# Altium footprint library Evaluation Board.PcbLib: 121 footprints (part 7 of 8)
Each footprint in its own frame and in the unit in brackets; x right, y up, seen from the top. Pads: shape width x height; smd on the part's side, far side on the other; paste and mask are expansions set on the pad; w line width, h text height; cw(c..) or ccw(c..) is an arc to the next point about the centre after c.
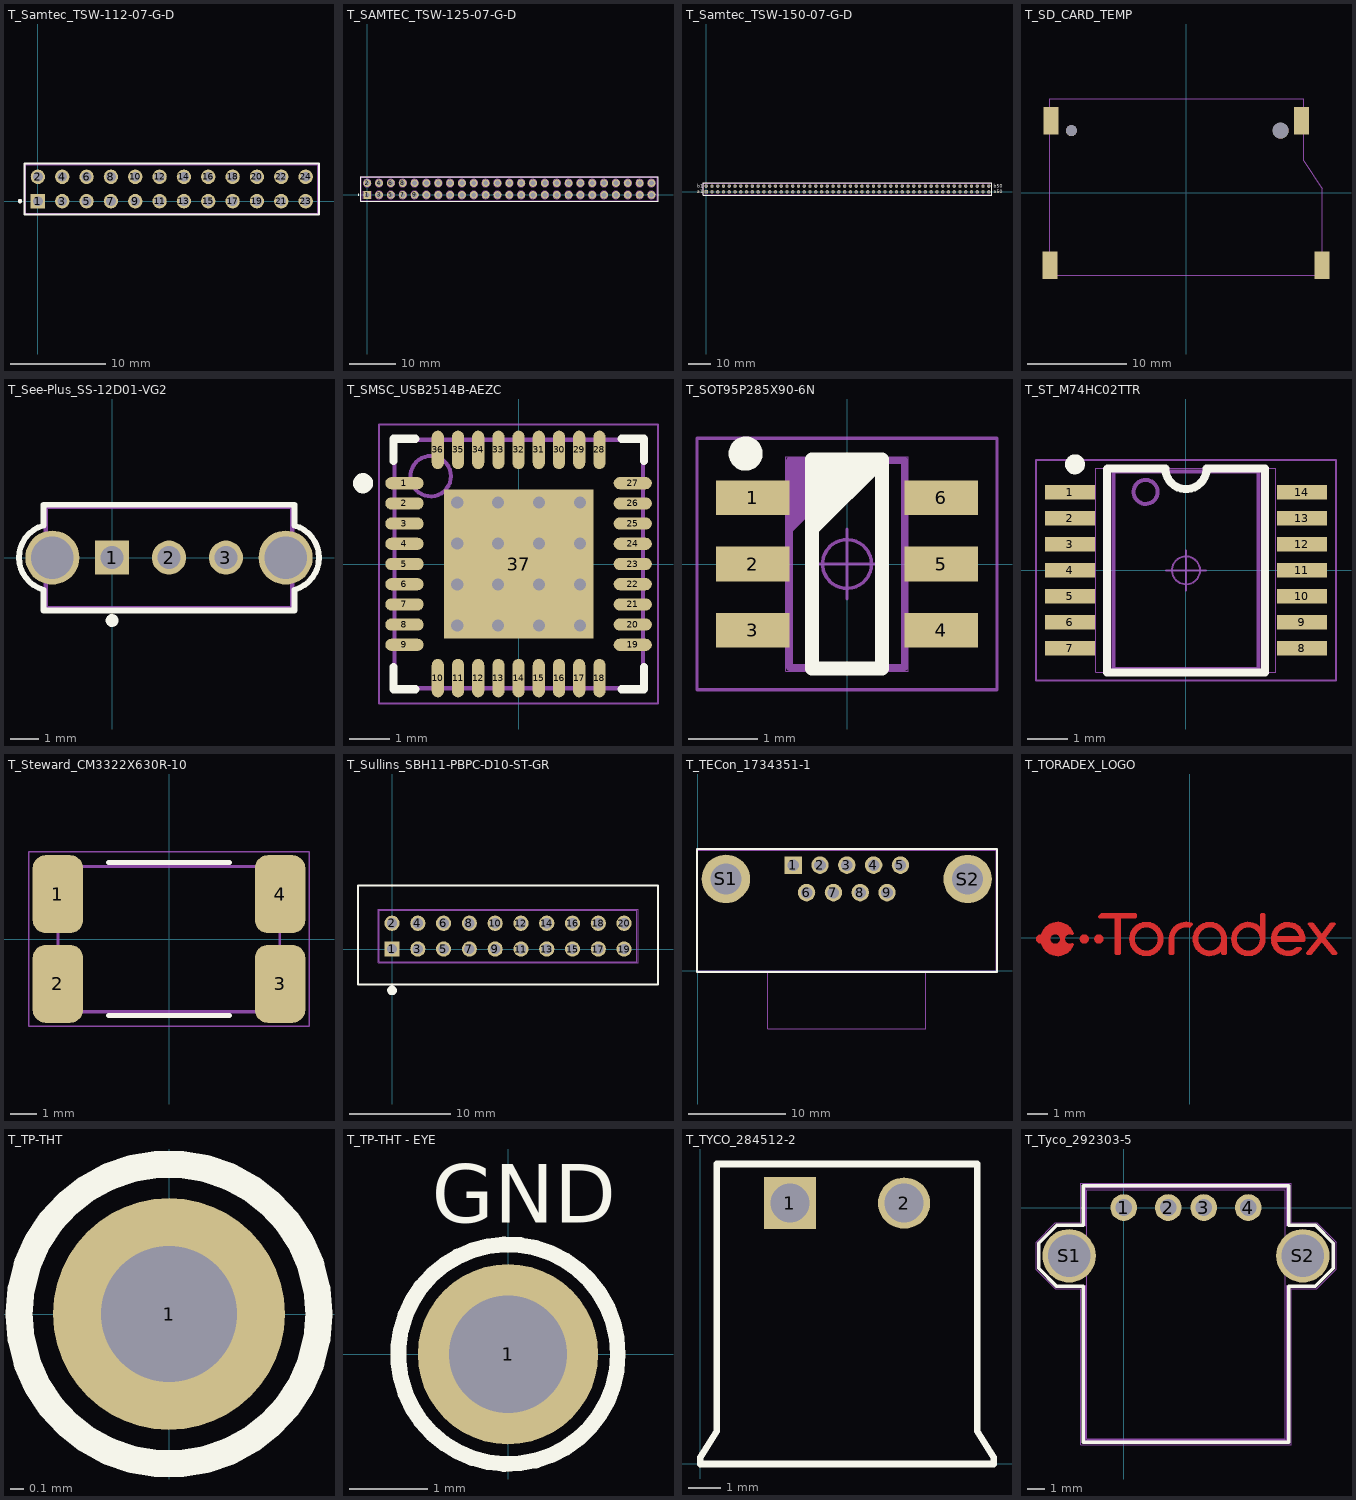
[diagram p6: the footprints below, top view; thin cyan lines are the x and y axes]

## T_Samtec_TSW-112-07-G-D [mm] "Header, 2x12 Pins, 2.54 mm pitch, male"
height 8.51
pads (24):
  rect 1.5x1.5 hole 1.016: 1(0,0)
  round 1.5 hole 1.016: 2(0,2.54) 3(2.54,0) 4(2.54,2.54) 5(5.08,0) 6(5.08,2.54) 7(7.62,0) 8(7.62,2.54) 9(10.16,0) 10(10.16,2.54) 11(12.7,0) 12(12.7,2.54) 13(15.24,0) 14(15.24,2.54) 15(17.78,0) 16(17.78,2.54) 17(20.32,0) 18(20.32,2.54) 19(22.86,0) 20(22.86,2.54) 21(25.4,0) 22(25.4,2.54) 23(27.94,0) 24(27.94,2.54)
Top Overlay:
  circle w0.25: c-1.871,0 r0.1
  lines w0.2: -1.395,-1.395 -1.395,3.935 29.335,3.935 29.335,-1.395 -1.395,-1.395
Mechanical 1:
  lines w0.05: -1.37,-1.373 -1.37,3.91 29.31,3.91 29.31,-1.373 -1.37,-1.373
Mechanical 2:
  lines w0.001: -1.27,-1.27 -1.27,3.81 29.21,3.81 29.21,-1.27 -1.27,-1.27
Mechanical 3:
  lines w0.1: -1.37,-1.37 -1.37,3.91 29.31,3.91 29.31,-1.37 -1.37,-1.37
3D body: height 8.4, standoff -2.52, extent -1.27,-1.27 29.21,3.81

## T_SAMTEC_TSW-125-07-G-D [mm] "Header, 2x25 Pins, 2.54 mm pitch"
height 8.51
pads (50):
  rect 1.65x1.65 hole 1.016: 1(0,0)
  round 1.65 hole 1.016: 2(0,2.54) 3(2.54,0) 4(2.54,2.54) 5(5.08,0) 6(5.08,2.54) 7(7.62,0) 8(7.62,2.54) 9(10.16,0) 10(10.16,2.54) 11(12.7,0) 12(12.7,2.54) 13(15.24,0) 14(15.24,2.54) 15(17.78,0) 16(17.78,2.54) 17(20.32,0) 18(20.32,2.54) 19(22.86,0) 20(22.86,2.54) 21(25.4,0) 22(25.4,2.54) 23(27.94,0) 24(27.94,2.54) 25(30.48,0) 26(30.48,2.54) 27(33.02,0) 28(33.02,2.54) 29(35.56,0) 30(35.56,2.54) 31(38.1,0) 32(38.1,2.54) 33(40.64,0) 34(40.64,2.54) 35(43.18,0) 36(43.18,2.54) 37(45.72,0) 38(45.72,2.54) 39(48.26,0) 40(48.26,2.54) 41(50.8,0) 42(50.8,2.54) 43(53.34,0) 44(53.34,2.54) 45(55.88,0) 46(55.88,2.54) 47(58.42,0) 48(58.42,2.54) 49(60.96,0) 50(60.96,2.54)
Top Overlay:
  circle w0.25: c-1.871,0 r0.1
  lines w0.2: -1.395,-1.395 62.355,-1.395 62.355,3.935 -1.395,3.935 -1.395,-1.395
Mechanical 1:
  circle w0.05: c0,0 r0.35
  lines w0.05: -0.5,0 0.5,0 ; 0,-0.5 0,0.5 ; -1.37,-1.369 -1.37,3.91 62.33,3.91 62.33,-1.369 -1.37,-1.369
Mechanical 2:
  lines w0.001: -1.27,-1.27 62.23,-1.27 62.23,3.81 -1.27,3.81 -1.27,-1.27
Mechanical 3:
  circle w0.1: c60.96,2.54 r0.825
  circle w0.1: c60.96,0 r0.825
  circle w0.1: c58.42,2.54 r0.825
  circle w0.1: c58.42,0 r0.825
  circle w0.1: c55.88,2.54 r0.825
  circle w0.1: c55.88,0 r0.825
  circle w0.1: c53.34,2.54 r0.825
  circle w0.1: c53.34,0 r0.825
  circle w0.1: c50.8,2.54 r0.825
  circle w0.1: c50.8,0 r0.825
  circle w0.1: c0,2.54 r0.825
  circle w0.1: c2.54,0 r0.825
  circle w0.1: c2.54,2.54 r0.825
  circle w0.1: c5.08,0 r0.825
  circle w0.1: c5.08,2.54 r0.825
  circle w0.1: c7.62,0 r0.825
  circle w0.1: c7.62,2.54 r0.825
  circle w0.1: c10.16,0 r0.825
  circle w0.1: c10.16,2.54 r0.825
  circle w0.1: c12.7,0 r0.825
  circle w0.1: c12.7,2.54 r0.825
  circle w0.1: c15.24,0 r0.825
  circle w0.1: c15.24,2.54 r0.825
  circle w0.1: c17.78,0 r0.825
  circle w0.1: c17.78,2.54 r0.825
  circle w0.1: c20.32,0 r0.825
  circle w0.1: c20.32,2.54 r0.825
  circle w0.1: c22.86,0 r0.825
  circle w0.1: c22.86,2.54 r0.825
  circle w0.1: c25.4,0 r0.825
  circle w0.1: c25.4,2.54 r0.825
  circle w0.1: c27.94,0 r0.825
  circle w0.1: c27.94,2.54 r0.825
  circle w0.1: c30.48,0 r0.825
  circle w0.1: c30.48,2.54 r0.825
  circle w0.1: c33.02,0 r0.825
  circle w0.1: c33.02,2.54 r0.825
  circle w0.1: c35.56,0 r0.825
  circle w0.1: c35.56,2.54 r0.825
  circle w0.1: c38.1,0 r0.825
  circle w0.1: c38.1,2.54 r0.825
  circle w0.1: c40.64,0 r0.825
  circle w0.1: c40.64,2.54 r0.825
  circle w0.1: c43.18,0 r0.825
  circle w0.1: c43.18,2.54 r0.825
  circle w0.1: c45.72,0 r0.825
  circle w0.1: c45.72,2.54 r0.825
  circle w0.1: c48.26,0 r0.825
  circle w0.1: c48.26,2.54 r0.825
  lines w0.1: -0.825,-0.825 -0.825,0.825 0.825,0.825 0.825,-0.825 ; -1.37,-1.369 62.33,-1.369 62.33,3.91 -1.37,3.91 -1.37,-1.369
3D body: height 8.38, standoff -2.54, extent -1.27,-1.27 62.23,3.81

## T_Samtec_TSW-150-07-G-D [mm] "Header 2x50 pin 2.54mm pitch"
height 10.8
pads (100):
  rect 1.5x1.5 hole 1: 1(0,0)
  round 1.5 hole 1: 2(0,2.54) 3(2.54,0) 4(2.54,2.54) 5(5.08,0) 6(5.08,2.54) 7(7.62,0) 8(7.62,2.54) 9(10.16,0) 10(10.16,2.54) 11(12.7,0) 12(12.7,2.54) 13(15.24,0) 14(15.24,2.54) 15(17.78,0) 16(17.78,2.54) 17(20.32,0) 18(20.32,2.54) 19(22.86,0) 20(22.86,2.54) 21(25.4,0) 22(25.4,2.54) 23(27.94,0) 24(27.94,2.54) 25(30.48,0) 26(30.48,2.54) 27(33.02,0) 28(33.02,2.54) 29(35.56,0) 30(35.56,2.54) 31(38.1,0) 32(38.1,2.54) 33(40.64,0) 34(40.64,2.54) 35(43.18,0) 36(43.18,2.54) 37(45.72,0) 38(45.72,2.54) 39(48.26,0) 40(48.26,2.54) 41(50.8,0) 42(50.8,2.54) 43(53.34,0) 44(53.34,2.54) 45(55.88,0) 46(55.88,2.54) 47(58.42,0) 48(58.42,2.54) 49(60.96,0) 50(60.96,2.54) 51(63.5,0) 52(63.5,2.54) 53(66.04,0) 54(66.04,2.54) 55(68.58,0) 56(68.58,2.54) 57(71.12,0) 58(71.12,2.54) 59(73.66,0) 60(73.66,2.54) 61(76.2,0) 62(76.2,2.54) 63(78.74,0) 64(78.74,2.54) 65(81.28,0) 66(81.28,2.54) 67(83.82,0) 68(83.82,2.54) 69(86.36,0) 70(86.36,2.54) 71(88.9,0) 72(88.9,2.54) 73(91.44,0) 74(91.44,2.54) 75(93.98,0) 76(93.98,2.54) 77(96.52,0) 78(96.52,2.54) 79(99.06,0) 80(99.06,2.54) 81(101.6,0) 82(101.6,2.54) 83(104.14,0) 84(104.14,2.54) 85(106.68,0) 86(106.68,2.54) 87(109.22,0) 88(109.22,2.54) 89(111.76,0) 90(111.76,2.54) 91(114.3,0) 92(114.3,2.54) 93(116.84,0) 94(116.84,2.54) 95(119.38,0) 96(119.38,2.54) 97(121.92,0) 98(121.92,2.54) 99(124.46,0) 100(124.46,2.54)
Top Overlay:
  lines w0.2: -1.395,-1.395 125.855,-1.395 125.855,3.935 -1.395,3.935 -1.395,-1.395
  text "a50" at 126.55,-0.65 h1.52
  text "b50" at 126.55,1.85 h1.52
  text "b1" at -4.07,1.82 h1.52
  text "a1" at -4.069,-0.7 h1.52
Mechanical 1:
  lines w0.05: -1.37,-1.37 125.83,-1.37 125.83,3.91 -1.37,3.91 -1.37,-1.37
Mechanical 2:
  lines w0.001: -1.27,-1.27 125.73,-1.27 125.73,3.81 -1.27,3.81 -1.27,-1.27
Mechanical 3:
  lines w0.1: -1.37,-1.37 -1.37,3.91 125.83,3.91 125.83,-1.37 -1.37,-1.37
3D body: height 8.4, standoff -2.52, extent -1.27,-1.27 125.73,3.81

## T_SD_CARD_TEMP [mm]
height 2.85
pads (6):
  rect 1.5x2.8 smd: ""(-13.65,-7.25) ""(-13.53,7.25) ""(11.57,7.25) ""(13.65,-7.25)
  round 1.1 hole 1.1: ""(-11.5,6.25)
  round 1.6 hole 1.6: ""(9.5,6.25)
Mechanical 2:
  lines w0.001: -13.68,-8.25 -13.68,9.45 11.82,9.45 11.82,3.25 13.68,0.45 13.68,-8.25 -13.68,-8.25
3D body: height 2.85, standoff 0, extent -13.68,-8.25 13.68,9.45

## T_See-Plus_SS-12D01-VG2 [mm] "Slide Switch"
height 5.5
pads (5):
  rect 1.2x1.2 hole 0.8: 1(0,0)
  round 1.2 hole 0.8: 2(2,0) 3(4,0)
  round 1.9 hole 1.5: ""(-2.1,0) ""(6.1,0)
Top Overlay:
  circle w0.25: c0,-2.21 r0.1
  lines w0.2: -2.423,1.124 ccw(c-2.1,0) -2.422,-1.125 ; -2.41,-1.13 -2.41,-1.86 6.41,-1.86 6.41,-1.13 ; -2.41,1.13 -2.41,1.86 6.41,1.86 6.41,1.13 ; 6.422,1.125 cw(c6.1,0) 6.423,-1.124
Mechanical 1:
  lines w0.05: -2.38,-1.83 -2.38,1.83 6.38,1.83 6.38,-1.83 -2.38,-1.83
Mechanical 2:
  lines w0.001: -2.3,-1.75 -2.3,1.75 6.3,1.75 6.3,-1.75 -2.3,-1.75
Mechanical 3:
  lines w0.1: -2.3,-1.75 6.3,-1.75 6.3,1.75 -2.3,1.75 -2.3,-1.75
3D body: height 6.5, standoff 3.5, extent -0.711,-0.711 0.711,0.711
3D body: height 3.5, standoff 0, extent -2.3,-1.75 6.3,1.75

## T_SMSC_USB2514B-AEZC [mm] "QFN, 36-Leads, Body 6x6mm, Pitch 0.5mm, IPC High Density"
height 1
pads (37):
  oval 0.95x0.3 smd: 1(-2.825,2) 2(-2.825,1.5) 3(-2.825,1) 4(-2.825,0.5) 5(-2.825,0) 6(-2.825,-0.5) 7(-2.825,-1) 8(-2.825,-1.5) 9(-2.825,-2) 19(2.825,-2) 20(2.825,-1.5) 21(2.825,-1) 22(2.825,-0.5) 23(2.825,0) 24(2.825,0.5) 25(2.825,1) 26(2.825,1.5) 27(2.825,2)
  oval 0.3x0.95 smd: 10(-2,-2.825) 11(-1.5,-2.825) 12(-1,-2.825) 13(-0.5,-2.825) 14(0,-2.825) 15(0.5,-2.825) 16(1,-2.825) 17(1.5,-2.825) 18(2,-2.825) 28(2,2.825) 29(1.5,2.825) 30(1,2.825) 31(0.5,2.825) 32(0,2.825) 33(-0.5,2.825) 34(-1,2.825) 35(-1.5,2.825) 36(-2,2.825)
  rect 3.7x3.7 smd paste-3.7: 37(0,0)
via 0.507,-1.52 diameter 0.6 hole 0.3
via -0.507,-1.52 diameter 0.6 hole 0.3
via 1.52,-0.507 diameter 0.6 hole 0.3
via 0.507,-0.507 diameter 0.6 hole 0.3
via -0.507,-0.507 diameter 0.6 hole 0.3
via -1.52,-0.507 diameter 0.6 hole 0.3
via 1.52,0.507 diameter 0.6 hole 0.3
via 0.507,0.507 diameter 0.6 hole 0.3
via -0.507,0.507 diameter 0.6 hole 0.3
via -1.52,0.507 diameter 0.6 hole 0.3
via 0.507,1.52 diameter 0.6 hole 0.3
via -0.507,1.52 diameter 0.6 hole 0.3
via -1.52,1.52 diameter 0.6 hole 0.3
via -1.52,-1.52 diameter 0.6 hole 0.3
via 1.52,-1.52 diameter 0.6 hole 0.3
via 1.52,1.52 diameter 0.6 hole 0.3
Top Overlay:
  circle w0.25: c-3.85,2 r0.125
  lines w0.2: -3.1,-2.55 -3.1,-3.1 -2.55,-3.1 ; -3.1,2.55 -3.1,3.1 -2.55,3.1 ; 2.55,-3.1 3.1,-3.1 3.1,-2.55 ; 2.55,3.1 3.1,3.1 3.1,2.55
Top Paste:
  region: 1.778,-0.508 1.778,0.508 0.762,0.508 0.762,-0.508
  region: 0.509,-0.507 0.509,0.509 -0.507,0.509 -0.507,-0.507
  region: 1.778,-1.778 1.778,-0.762 0.762,-0.762 0.762,-1.778
  region: 0.508,-1.778 0.508,-0.762 -0.508,-0.762 -0.508,-1.778
  region: -0.762,-1.778 -0.762,-0.762 -1.778,-0.762 -1.778,-1.778
  region: -1.778,-0.508 -0.762,-0.508 -0.762,0.508 -1.778,0.508
  region: 0.762,1.778 0.762,0.762 1.778,0.762 1.778,1.778
  region: -0.508,0.762 0.508,0.762 0.508,1.778 -0.508,1.778
  region: -1.778,0.762 -0.762,0.762 -0.762,1.778 -1.778,1.778
Mechanical 1:
  lines w0.05: -3.45,-3.45 -3.45,3.45 3.45,3.45 3.45,-3.45 -3.45,-3.45
Mechanical 2:
  lines w0.001: -3.075,-3.075 -3.075,3.075 3.075,3.075 3.075,-3.075 -3.075,-3.075
Mechanical 3:
  circle w0.1: c-2.175,2.175 r0.5
  lines w0.1: -3.075,-3.075 3.075,-3.075 3.075,3.075 -3.075,3.075 -3.075,-3.075
3D body: height 0.91, standoff 0.01, extent -3.103,-3.103 3.103,3.103

## T_SOT95P285X90-6N [mm]
height 1.45
pads (6):
  rect 1.05x0.5 smd: 1(-1.35,0.95) 2(-1.35,0) 3(-1.35,-0.95) 4(1.35,-0.95) 5(1.35,0) 6(1.35,0.95)
Top Overlay:
  circle w0.25: c-1.453,1.582 r0.12
  lines w0.2: -0.5,0.5 0.5,1.5 ; -0.5,0.7 0.3,1.5 ; -0.5,0.9 0.1,1.5 ; -0.5,1.1 -0.1,1.5 ; -0.5,1.3 -0.3,1.5 ; 0.5,1.5 0.5,-1.5 -0.5,-1.5 -0.5,1.5 0.5,1.5
Mechanical 1:
  circle w0.05: c0,0 r0.35
  lines w0.05: -0.5,0 0.5,0 ; 0,-0.5 0,0.5 ; -2.15,-1.8 2.15,-1.8 2.15,1.8 -2.15,1.8 -2.15,-1.8
Mechanical 2:
  lines w0.001: -0.875,-1.535 0.875,-1.535 0.875,1.535 -0.875,1.535 -0.875,-1.535
Mechanical 3:
  lines w0.1: -0.825,0.485 0.175,1.485 ; -0.825,0.585 0.075,1.485 ; -0.825,0.685 -0.025,1.485 ; -0.825,0.785 -0.125,1.485 ; -0.825,0.885 -0.225,1.485 ; -0.825,0.985 -0.325,1.485 ; -0.825,1.085 -0.425,1.485 ; -0.825,1.185 -0.525,1.485 ; -0.825,1.285 -0.625,1.485 ; -0.825,1.385 -0.725,1.485 ; -0.825,-1.485 0.825,-1.485 0.825,1.485 -0.825,1.485 -0.825,-1.485
3D body: height 1.45, standoff 0, extent -0.875,-1.535 0.875,1.535

## T_ST_M74HC02TTR [mm] "Shrink Small Outline; 14 Leads; Body Width 4.4 mm; Pitch 0.65 mm"
height 1.15
pads (14):
  rect 1.26x0.36 smd: 1(-2.9,1.95) 2(-2.9,1.3) 3(-2.9,0.65) 4(-2.9,0) 5(-2.9,-0.65) 6(-2.9,-1.3) 7(-2.9,-1.95) 8(2.9,-1.95) 9(2.9,-1.3) 10(2.9,-0.65) 11(2.9,0) 12(2.9,0.65) 13(2.9,1.3) 14(2.9,1.95)
Top Overlay:
  circle w0.25: c-2.775,2.65 r0.125
  lines w0.2: -1.97,-2.55 1.97,-2.55 1.97,2.55 0.517,2.55 cw(c0,2.55) -0.517,2.55 -1.959,2.55 -1.97,2.539 -1.97,-2.55
Mechanical 1:
  circle w0.05: c0,0 r0.35
  lines w0.05: -0.5,0 0.5,0 ; 0,-0.5 0,0.5 ; -3.75,-2.75 3.75,-2.75 3.75,2.762 -3.75,2.762 -3.75,-2.75
Mechanical 2:
  lines w0.001: -2.25,-2.55 2.25,-2.55 2.25,2.55 -2.25,2.55 -2.25,-2.55
Mechanical 3:
  circle w0.1: c-1.008,1.961 r0.3
  lines w0.1: -1.817,-2.472 -1.817,2.466 1.815,2.466 1.815,-2.472 -1.817,-2.472
3D body: height 1.15, standoff 0, extent -2.25,-2.55 2.25,2.55

## T_Steward_CM3322X630R-10 [mm] "Common Mode Choke"
height 2.85
pads (4):
  rrect50% 1.91x2.95 smd: 1(-4.22,1.705) 2(-4.22,-1.705) 3(4.22,-1.705) 4(4.22,1.705)
Top Overlay:
  lines w0.2: -2.3,-2.902 2.3,-2.902 ; -2.3,2.904 2.3,2.904
Mechanical 1:
  lines w0.05: -5.316,-3.321 -5.316,3.321 5.316,3.321 5.316,-3.321 -5.316,-3.321
Mechanical 2:
  lines w0.001: -4.25,-2.8 -4.25,2.8 4.25,2.8 4.25,-2.8 -4.25,-2.8
Mechanical 3:
  lines w0.1: -4.2,-2.75 -4.2,2.75 4.2,2.75 4.2,-2.75 -4.2,-2.75

## T_Sullins_SBH11-PBPC-D10-ST-GR [mm] "Header shrouded, 2x10 Pins, 2.54 mm pitch"
height 8.51
pads (20):
  rect 1.5x1.5 hole 1.016: 1(0,0)
  round 1.5 hole 1.016: 2(0,2.54) 3(2.54,0) 4(2.54,2.54) 5(5.08,0) 6(5.08,2.54) 7(7.62,0) 8(7.62,2.54) 9(10.16,0) 10(10.16,2.54) 11(12.7,0) 12(12.7,2.54) 13(15.24,0) 14(15.24,2.54) 15(17.78,0) 16(17.78,2.54) 17(20.32,0) 18(20.32,2.54) 19(22.86,0) 20(22.86,2.54)
Top Overlay:
  circle w0.5: c0,-4.075 r0.224
  lines w0.2: -3.352,-3.475 26.2,-3.475 26.2,6.275 -3.352,6.275 -3.352,-3.475
Mechanical 1:
  lines w0.05: -1.37,-1.374 -1.37,3.916 24.23,3.916 24.23,-1.374 -1.37,-1.374
Mechanical 2:
  lines w0.001: -1.27,-1.27 -1.27,3.81 24.13,3.81 24.13,-1.27 -1.27,-1.27
Mechanical 3:
  lines w0.1: -1.37,-1.37 -1.37,3.91 24.23,3.91 24.23,-1.37 -1.37,-1.37
3D body: height 9.29, standoff -3.41, extent -5.08,-3.175 27.94,5.715

## T_TECon_1734351-1 [mm] "9 pin male D-SUB connector"
height 12.55
pads (11):
  rect 1.8x1.8 hole 1.2: 1(9.842,10.932)
  round 1.8 hole 1.2: 2(12.612,10.932) 3(15.382,10.932) 4(18.152,10.932) 5(20.922,10.932) 6(11.227,8.092) 7(13.997,8.092) 8(16.767,8.092) 9(19.537,8.092)
  round 5 hole 3.2: S1(2.887,9.512) S2(27.877,9.499)
Top Overlay:
  lines w0.2: -0.102,-0.101 30.902,-0.101 30.902,12.602 -0.102,12.602 -0.102,-0.101
Mechanical 1:
  lines w0.05: -0.098,-0.094 30.904,-0.094 30.904,12.598 -0.098,12.598 -0.098,-0.094
Mechanical 2:
  lines w0.001: 7.217,0.003 7.217,-6.001 23.547,-6.001 23.547,0.003 ; 0,0 0,12.499 30.801,12.499 30.801,0 0,0
Mechanical 3:
  lines w0.1: -0.098,-0.096 30.904,-0.096 30.904,12.598 -0.098,12.598 -0.098,-0.096
3D body: height 12.52, standoff -3.98, extent 0,-6.001 30.8,12.499

## T_TORADEX_LOGO [mm] "Toradex Logo"
Top Layer:
  lines w0.15: -7.116,-0.05 -7,-0.05 ; -7.115,-0.198 cw(c-7.136,-0.05) -7.286,-0.05 cw(c-7.136,-0.05) -7.115,0.099 ; -7.044,-0.26 ccw(c-6.322,-0.05) -5.621,-0.319 ; -7.044,0.16 cw(c-6.322,-0.05) -5.621,0.22 ; -6.911,-0.118 ccw(c-7.104,-0.277) -7,-0.05 ; -6.911,0.019 cw(c-7.104,0.178) -7,-0.05 ; -6.764,-0.4 ccw(c-6.322,-0.05) -5.955,-0.477 cw(c-5.738,-0.05) -6.087,-0.379 cw(c-6.436,-0.05) -6.916,-0.05 cw(c-6.436,-0.05) -6.087,0.28 cw(c-5.738,-0.05) -5.955,0.378 ccw(c-6.322,-0.05) -6.764,0.301 ; -6.484,-0.59 ccw(c-6.436,-0.05) -6.087,-0.465 ccw(c-5.738,-0.05) -6.067,-0.481 cw(c-6.322,-0.05) -6.192,-0.533 ; -6.484,0.491 cw(c-6.436,-0.05) -6.087,0.366 cw(c-5.738,-0.05) -6.067,0.382 ccw(c-6.322,-0.05) -6.192,0.434 ; -5.636,-0.331 cw(c-5.738,-0.05) -5.636,0.232 ; 4.083,-0.046 4.702,-0.046 5.383,-0.046 ccw(c4.702,-0.05) 5.214,-0.499 ; 4.087,-0.116 4.702,-0.116 5.45,-0.116 ccw(c4.702,-0.05) 5.304,-0.499 5.127,-0.499 cw(c4.702,-0.05) 5.317,0.017 4.702,0.017 4.087,0.017 ; -7.241,-0.05 cw(c-7.136,-0.05) -7.121,0.054 ccw(c-7.104,0.178) -6.984,0.143 cw(c-6.322,-0.05) -5.732,0.305 ccw(c-5.738,-0.05) -6.087,0.015 ccw(c-6.436,-0.05) -6.087,-0.114 ccw(c-5.738,-0.05) -5.732,-0.404 cw(c-6.322,-0.05) -6.984,-0.242 ccw(c-7.104,-0.277) -7.121,-0.153 ; -7.241,-0.05 ccw(c-7.136,-0.05) -7.121,-0.153 ; -7.241,-0.05 ccw(c-7.136,-0.05) -7.121,-0.153 ; -7.178,-0.05 cw(c-7.136,-0.05) -7.13,-0.008 ccw(c-7.104,0.178) -6.924,0.126 cw(c-6.322,-0.05) -5.844,0.354 ccw(c-5.738,-0.05) -6.087,0.179 ccw(c-6.436,-0.05) -6.087,-0.278 ccw(c-5.738,-0.05) -5.844,-0.453 cw(c-6.322,-0.05) -6.924,-0.225 ccw(c-7.104,-0.277) -7.13,-0.091 cw(c-7.136,-0.05) -7.178,-0.05 ; -6.736,-0.05 ccw(c-6.436,-0.05) -6.136,-0.05 ccw(c-6.436,-0.05) -6.736,-0.05 ; -5.194,-0.05 cw(c-5.044,-0.05) -4.894,-0.05 cw(c-5.044,-0.05) -5.194,-0.05 ; -5.149,-0.05 cw(c-5.044,-0.05) -4.939,-0.05 cw(c-5.044,-0.05) -5.149,-0.05 ; -5.086,-0.05 cw(c-5.044,-0.05) -5.002,-0.05 cw(c-5.044,-0.05) -5.086,-0.05 ; -4.498,-0.05 cw(c-4.348,-0.05) -4.198,-0.05 cw(c-4.348,-0.05) -4.498,-0.05 ; -4.453,-0.05 cw(c-4.348,-0.05) -4.243,-0.05 cw(c-4.348,-0.05) -4.453,-0.05 ; -4.39,-0.05 cw(c-4.348,-0.05) -4.306,-0.05 cw(c-4.348,-0.05) -4.39,-0.05 ; -4.322,0.994 -3.523,0.994 -3.523,-0.75 -3.372,-0.75 -3.372,0.994 -2.603,0.994 -2.603,1.125 -4.218,1.125 -4.322,0.994 ; -4.192,1.057 -3.46,1.057 -3.46,-0.688 -3.434,-0.688 -3.434,1.057 -2.665,1.057 -2.665,1.062 -4.188,1.062 -4.192,1.057 ; -2.827,-0.05 cw(c-2.076,-0.05) -1.324,-0.05 cw(c-2.076,-0.05) -2.827,-0.05 ; -2.764,-0.05 cw(c-2.076,-0.05) -1.387,-0.05 cw(c-2.076,-0.05) -2.764,-0.05 ; -2.694,-0.05 cw(c-2.076,-0.05) -1.457,-0.05 cw(c-2.076,-0.05) -2.694,-0.05 ; -0.939,-0.75 -0.806,-0.75 -0.806,-0.05 cw(c-0.188,-0.05) -0.009,0.542 cw(c0.958,-0.05) 0.071,0.656 ccw(c-0.188,-0.05) -0.939,-0.05 -0.939,-0.75 ; -0.877,-0.688 -0.869,-0.688 -0.869,-0.05 cw(c-0.188,-0.05) -0.037,0.615 cw(c0.958,-0.049) -0.032,0.621 ccw(c-0.188,-0.05) -0.877,-0.05 -0.877,-0.688 ; 0.207,-0.05 cw(c0.958,-0.05) 1.709,-0.05 1.709,-0.75 1.576,-0.75 1.576,-0.476 cw(c0.958,-0.05) 0.207,-0.05 ; 0.269,-0.05 cw(c0.958,-0.05) 1.647,-0.05 1.647,-0.688 1.639,-0.688 1.639,-0.153 cw(c0.958,-0.05) 0.269,-0.05 ; 0.339,-0.05 ccw(c0.958,-0.05) 1.576,-0.05 ccw(c0.958,-0.05) 0.339,-0.05 ; 2.053,-0.05 cw(c2.804,-0.05) 3.423,0.377 3.423,1.125 3.556,1.125 3.556,-0.05 cw(c2.804,-0.05) 2.053,-0.05 ; 2.116,-0.05 cw(c2.804,-0.05) 3.485,0.054 3.485,1.062 3.493,1.062 3.493,-0.05 cw(c2.804,-0.05) 2.116,-0.05 ; 2.186,-0.05 ccw(c2.804,-0.05) 3.423,-0.05 ccw(c2.804,-0.05) 2.186,-0.05 ; 5.623,-0.75 5.791,-0.75 6.314,-0.086 6.835,-0.75 6.995,-0.75 6.403,0.006 6.919,0.664 6.749,0.664 6.314,0.1 5.879,0.664 5.716,0.664 6.23,0.006 5.623,-0.75 ; 5.753,-0.688 5.761,-0.688 6.315,0.015 6.865,-0.688 6.866,-0.688 6.323,0.006 6.79,0.602 6.78,0.602 6.314,-0.002 5.849,0.602 5.844,0.602 6.309,0.005 5.753,-0.688
Top Solder:
  lines w0.35: -7.116,-0.05 -7,-0.05 ; -7.115,-0.198 cw(c-7.136,-0.05) -7.286,-0.05 cw(c-7.136,-0.05) -7.115,0.099 ; -7.113,-0.215 cw(c-7.104,-0.277) -7.044,-0.26 ccw(c-6.322,-0.05) -5.621,-0.319 ; -7.113,0.116 ccw(c-7.104,0.178) -7.044,0.16 cw(c-6.322,-0.05) -5.621,0.22 ; -6.911,-0.118 ccw(c-7.104,-0.277) -7,-0.05 ; -6.911,0.019 cw(c-7.104,0.178) -7,-0.05 ; -6.764,-0.4 ccw(c-6.322,-0.05) -5.955,-0.477 cw(c-5.738,-0.05) -6.087,-0.379 cw(c-6.436,-0.05) -6.916,-0.05 cw(c-6.436,-0.05) -6.087,0.28 cw(c-5.738,-0.05) -5.955,0.378 ccw(c-6.322,-0.05) -6.764,0.301 ; -6.484,-0.59 ccw(c-6.436,-0.05) -6.087,-0.465 ccw(c-5.738,-0.05) -6.067,-0.481 cw(c-6.322,-0.05) -6.192,-0.533 ; -6.484,0.491 cw(c-6.436,-0.05) -6.087,0.366 cw(c-5.738,-0.05) -6.067,0.382 ccw(c-6.322,-0.05) -6.192,0.434 ; -5.631,-0.33 cw(c-5.738,-0.05) -5.631,0.231 ; 4.083,-0.046 4.702,-0.046 5.383,-0.046 ccw(c4.702,-0.05) 5.214,-0.499 ; 4.087,-0.116 4.702,-0.116 5.45,-0.116 ccw(c4.702,-0.05) 5.304,-0.499 5.127,-0.499 cw(c4.702,-0.05) 5.317,0.017 4.702,0.017 4.087,0.017 ; -7.241,-0.05 cw(c-7.136,-0.05) -7.121,0.054 ccw(c-7.104,0.178) -6.984,0.143 cw(c-6.322,-0.05) -5.732,0.305 ccw(c-5.738,-0.05) -6.087,0.015 ccw(c-6.436,-0.05) -6.087,-0.114 ccw(c-5.738,-0.05) -5.732,-0.404 cw(c-6.322,-0.05) -6.984,-0.242 ccw(c-7.104,-0.277) -7.121,-0.153 ; -7.241,-0.05 ccw(c-7.136,-0.05) -7.121,-0.153 ; -7.241,-0.05 ccw(c-7.136,-0.05) -7.121,-0.153 ; -7.178,-0.05 cw(c-7.136,-0.05) -7.13,-0.008 ccw(c-7.104,0.178) -6.924,0.126 cw(c-6.322,-0.05) -5.844,0.354 ccw(c-5.738,-0.05) -6.087,0.179 ccw(c-6.436,-0.05) -6.087,-0.278 ccw(c-5.738,-0.05) -5.844,-0.453 cw(c-6.322,-0.05) -6.924,-0.225 ccw(c-7.104,-0.277) -7.13,-0.091 cw(c-7.136,-0.05) -7.178,-0.05 ; -6.736,-0.05 ccw(c-6.436,-0.05) -6.136,-0.05 ccw(c-6.436,-0.05) -6.736,-0.05 ; -5.194,-0.05 cw(c-5.044,-0.05) -4.894,-0.05 cw(c-5.044,-0.05) -5.194,-0.05 ; -5.149,-0.05 cw(c-5.044,-0.05) -4.939,-0.05 cw(c-5.044,-0.05) -5.149,-0.05 ; -5.086,-0.05 cw(c-5.044,-0.05) -5.002,-0.05 cw(c-5.044,-0.05) -5.086,-0.05 ; -4.498,-0.05 cw(c-4.348,-0.05) -4.198,-0.05 cw(c-4.348,-0.05) -4.498,-0.05 ; -4.453,-0.05 cw(c-4.348,-0.05) -4.243,-0.05 cw(c-4.348,-0.05) -4.453,-0.05 ; -4.39,-0.05 cw(c-4.348,-0.05) -4.306,-0.05 cw(c-4.348,-0.05) -4.39,-0.05 ; -4.322,0.994 -3.523,0.994 -3.523,-0.75 -3.372,-0.75 -3.372,0.994 -2.603,0.994 -2.603,1.125 -4.218,1.125 -4.322,0.994 ; -4.192,1.057 -3.46,1.057 -3.46,-0.688 -3.434,-0.688 -3.434,1.057 -2.665,1.057 -2.665,1.062 -4.188,1.062 -4.192,1.057 ; -2.827,-0.05 cw(c-2.076,-0.05) -1.324,-0.05 cw(c-2.076,-0.05) -2.827,-0.05 ; -2.764,-0.05 cw(c-2.076,-0.05) -1.387,-0.05 cw(c-2.076,-0.05) -2.764,-0.05 ; -2.694,-0.05 cw(c-2.076,-0.05) -1.457,-0.05 cw(c-2.076,-0.05) -2.694,-0.05 ; -0.939,-0.75 -0.806,-0.75 -0.806,-0.05 cw(c-0.188,-0.05) -0.009,0.542 cw(c0.958,-0.05) 0.071,0.656 ccw(c-0.188,-0.05) -0.939,-0.05 -0.939,-0.75 ; -0.877,-0.688 -0.869,-0.688 -0.869,-0.05 cw(c-0.188,-0.05) -0.037,0.615 cw(c0.958,-0.049) -0.032,0.621 ccw(c-0.188,-0.05) -0.877,-0.05 -0.877,-0.688 ; 0.207,-0.05 cw(c0.958,-0.05) 1.709,-0.05 1.709,-0.75 1.576,-0.75 1.576,-0.476 cw(c0.958,-0.05) 0.207,-0.05 ; 0.269,-0.05 cw(c0.958,-0.05) 1.647,-0.05 1.647,-0.688 1.639,-0.688 1.639,-0.153 cw(c0.958,-0.05) 0.269,-0.05 ; 0.339,-0.05 ccw(c0.958,-0.05) 1.576,-0.05 ccw(c0.958,-0.05) 0.339,-0.05 ; 2.053,-0.05 cw(c2.804,-0.05) 3.423,0.377 3.423,1.125 3.556,1.125 3.556,-0.05 cw(c2.804,-0.05) 2.053,-0.05 ; 2.116,-0.05 cw(c2.804,-0.05) 3.485,0.054 3.485,1.062 3.493,1.062 3.493,-0.05 cw(c2.804,-0.05) 2.116,-0.05 ; 2.186,-0.05 ccw(c2.804,-0.05) 3.423,-0.05 ccw(c2.804,-0.05) 2.186,-0.05 ; 5.623,-0.75 5.791,-0.75 6.314,-0.086 6.835,-0.75 6.995,-0.75 6.403,0.006 6.919,0.664 6.749,0.664 6.314,0.1 5.879,0.664 5.716,0.664 6.23,0.006 5.623,-0.75 ; 5.753,-0.688 5.761,-0.688 6.315,0.015 6.865,-0.688 6.866,-0.688 6.323,0.006 6.79,0.602 6.78,0.602 6.314,-0.002 5.849,0.602 5.844,0.602 6.309,0.005 5.753,-0.688

## T_TP-THT [mm] "Testpin TH"
pads (1):
  round 1.7 hole 1: 1(0,0)
Top Overlay:
  circle w0.2: c0,0 r1.1

## T_TP-THT - EYE [mm] "Testpin TH"
pads (1):
  round 2.3 hole 1.5: 1(0,0)
Top Overlay:
  circle w0.2: c0,0 r1.4
  text "GND" at -0.975,1.675 h0.75
3D body: height 8.14, standoff -3.08, extent -1.587,-1.587 1.588,1.588

## T_TYCO_284512-2 [mm] "Power Connector 3.5mm"
height 7.3
pads (2):
  rect 1.6x1.6 hole 1.2: 1(2.75,8)
  oval 1.6x1.56 hole 1.2: 2(6.25,8)
Top Overlay:
  lines w0.2: 0,0 0,0.2 0.5,1 0.5,9.2 8.5,9.2 8.5,1 9,0.2 9,0 0.001,0
Mechanical 1:
  lines w0.05: 0,0 0,0.2 0.5,1 0.5,9.2 8.5,9.2 8.5,1 9,0.2 9,0 0,0
Mechanical 2:
  lines w0.001: 0,0 0,0.2 0.5,1 0.5,9.2 8.5,9.2 8.5,1 9,0.2 9,0 0,0
Mechanical 3:
  lines w0.1: 0,0 0,0.2 0.5,1 0.5,9.2 8.5,9.2 8.5,1 9,0.2 9,0 0,0
3D body: height 7.27, standoff -3.38, extent 0,0 9,9.2

## T_Tyco_292303-5 [mm] "USB Type A Connector"
height 7.01
pads (6):
  round 1.5 hole 0.95: 1(0,0) 2(2.5,0) 3(4.5,0) 4(7,0)
  round 3 hole 2.38: S1(-3.07,-2.71) S2(10.07,-2.71)
Top Overlay:
  lines w0.2: -4.78,-3.415 -3.78,-4.415 -2.27,-4.415 -2.27,-13.19 9.27,-13.19 9.27,-4.415 10.77,-4.415 11.78,-3.405 11.78,-1.995 10.78,-0.995 9.27,-0.995 9.27,1.23 -2.27,1.23 -2.27,-0.995 -3.77,-0.995 -4.78,-2.005 -4.78,-3.415
Mechanical 1:
  lines w0.05: -4.93,-3.485 -3.85,-4.565 -2.42,-4.565 -2.42,-13.34 9.42,-13.34 9.42,-4.565 10.84,-4.565 11.93,-3.475 11.93,-1.935 10.84,-0.845 9.42,-0.845 9.42,1.38 -2.42,1.38 -2.42,-0.845 -3.84,-0.845 -4.93,-1.935 -4.93,-3.485
Mechanical 2:
  lines w0.001: -2.065,-12.99 -2.065,1.01 9.065,1.01 9.065,-12.99 -2.065,-12.99
Mechanical 3:
  lines w0.1: -2.16,-13.09 -2.16,-4.405 ; -2.16,-13.08 9.16,-13.08 ; -2.16,-1.019 -2.16,1.11 9.16,1.11 9.16,-1.019 ; 9.16,-13.09 9.16,-4.405